# Altium footprint library Pezo_imp.PCBLIB: 98 footprints (part 1 of 7)
Each footprint in its own frame and in the unit in brackets; x right, y up, seen from the top. Pads: shape width x height; smd on the part's side, far side on the other; paste and mask are expansions set on the pad; w line width, h text height; cw(c..) or ccw(c..) is an arc to the next point about the centre after c.
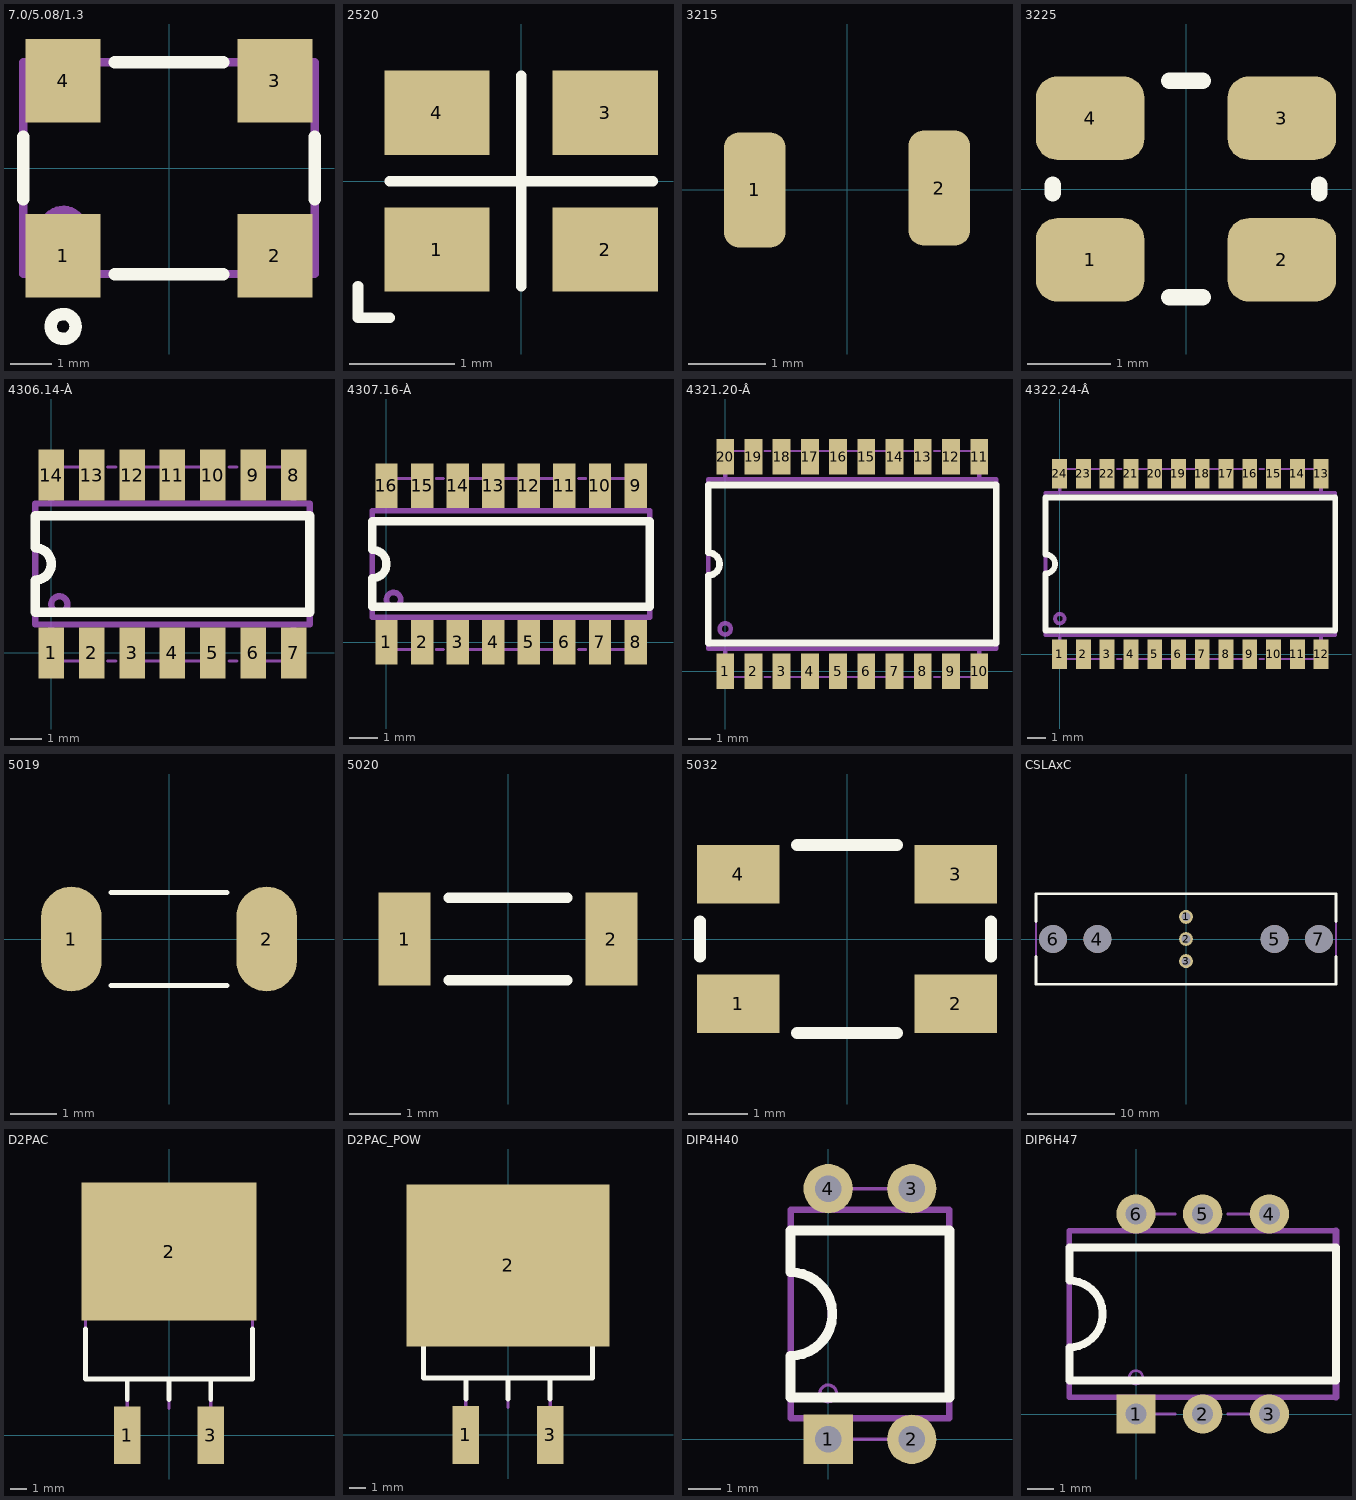
[diagram p0: the footprints below, top view; thin cyan lines are the x and y axes]

## 7.0/5.08/1.3 [mm]
height 1.3
pads (4):
  rect 1.8x2 smd: 1(-2.54,-2.1) 2(2.54,-2.1) 3(2.54,2.1) 4(-2.54,2.1)
Top Overlay:
  circle w0.3: c-2.54,-3.8 r0.3
  lines w0.3: -3.5,-0.75 -3.5,0.75 ; -1.3,-2.54 1.3,-2.54 ; -1.3,2.54 1.3,2.54 ; 3.5,-0.75 3.5,0.75
Mechanical 1:
  circle w0.2: c-2.54,-1.5 r0.5
  lines w0.2: -3.5,-2.54 -3.5,2.54 -2.84,2.54 ccw(c-2.54,2.54) -2.24,2.54 2.24,2.54 ccw(c2.54,2.54) 2.84,2.54 3.5,2.54 3.5,-2.54 2.84,-2.54 ccw(c2.54,-2.54) 2.24,-2.54 -2.24,-2.54 ccw(c-2.54,-2.54) -2.84,-2.54 -3.5,-2.54
  text "4" at -3.125,3.425 h1.5
  text "3" at 2.05,3.425 h1.5
  text "2" at 2.1,-5.1 h1.5
  text "1" at -2.875,-5.05 h1.5
  text ".Comment" at -3.025,-0.65 h1.5
  text ".Designator" at -3.075,0.8 h1.5

## 2520 [mm] "2.5x2.0x0.82mm Crystal"
height 0.8
pads (4):
  rect 1x0.8 smd: 1(-0.8,-0.65) 2(0.8,-0.65) 3(0.8,0.65) 4(-0.8,0.65)
Top Overlay:
  lines w0.1: -1.55,-1 -1.55,-1.3 -1.25,-1.3 ; -1.25,0 1.25,0 ; 0,-1 0,1
3D body "User Library-SM2520-4.step": height 0.8, standoff -0.03, extent -1.25,-1 1.25,1

## 3215 [mm]
pads (2):
  rrect50% 0.8x1.5 smd: 1(-1.2,0) 2(1.2,0.025)
3D body "User Library-KX-327NHT-1.step": height 0.72, standoff 0.01, extent -1.6,-0.75 1.6,0.75

## 3225 [mm] "3.2x2.5x0.8mm Crystal"
height 0.8
pads (4):
  rrect50% 1.3x1 smd: 1(-1.15,-0.85) 2(1.15,-0.85) 3(1.15,0.85) 4(-1.15,0.85)
Top Overlay:
  lines w0.2: -1.6,-0.05 -1.6,0.05 ; -0.2,-1.3 0.2,-1.3 ; -0.2,1.3 0.2,1.3 ; 1.6,-0.05 1.6,0.05
3D body "KX7.STEP": height 0.82, standoff 0.02, extent -1.607,-1.25 1.607,1.25

## 4306.14-À [mm]
height 1.7
pads (14):
  rect 0.8x1.6 smd: 1(0,0) 2(1.27,0) 3(2.54,0) 4(3.81,0) 5(5.08,0) 6(6.35,0) 7(7.62,0) 8(7.62,5.588) 9(6.35,5.588) 10(5.08,5.588) 11(3.81,5.588) 12(2.54,5.588) 13(1.27,5.588) 14(0,5.588)
Top Overlay:
  lines w0.3: -0.508,1.27 -0.508,2.286 ccw(c-0.508,2.794) -0.508,3.302 -0.508,4.318 8.128,4.318 8.128,1.27 -0.508,1.27
Mechanical 1:
  circle w0.2: c0.254,1.524 r0.254
  lines w0.1: 0,-0.254 1.27,-0.254 ; 0,5.842 1.27,5.842 ; 1.778,-0.254 2.032,-0.254 ; 1.778,5.842 2.032,5.842 ; 2.54,-0.254 5.08,-0.254 ; 2.54,5.842 5.08,5.842 ; 5.588,-0.254 5.842,-0.254 ; 5.588,5.842 5.842,5.842 ; 6.35,-0.254 7.62,-0.254 ; 6.35,5.842 7.62,5.842
  lines w0.2: 0,-0.254 0,0.762 ; 0,4.826 0,5.842 ; 7.62,-0.254 7.62,0.762 ; 7.62,4.826 7.62,5.842 ; -0.508,0.889 -0.508,4.699 8.128,4.699 8.128,0.889 -0.508,0.889
  text "14" at 0.01,3.4 h1.5
  text ".Comment" at 0.97,2.06 h1.5
  text ".Designator" at 2.05,3.48 h1.5
3D body "SO14h17.stp": height 1.71, standoff 0, extent -0.6,-0.35 8.21,5.95

## 4307.16-À [mm]
height 1.7
pads (16):
  rect 0.8x1.6 smd: 1(0,0) 2(1.27,0) 3(2.54,0) 4(3.81,0) 5(5.08,0) 6(6.35,0) 7(7.62,0) 8(8.89,0) 9(8.89,5.588) 10(7.62,5.588) 11(6.35,5.588) 12(5.08,5.588) 13(3.81,5.588) 14(2.54,5.588) 15(1.27,5.588) 16(0,5.588)
Top Overlay:
  lines w0.3: -0.508,1.27 -0.508,2.286 ccw(c-0.508,2.794) -0.508,3.302 -0.508,4.318 9.398,4.318 9.398,1.27 -0.508,1.27
Mechanical 1:
  circle w0.2: c0.254,1.524 r0.254
  lines w0.1: 0,-0.254 1.27,-0.254 ; 0,5.842 1.27,5.842 ; 1.778,-0.254 2.032,-0.254 ; 1.778,5.842 2.032,5.842 ; 2.54,-0.254 6.35,-0.254 ; 2.54,5.842 6.35,5.842 ; 6.858,-0.254 7.112,-0.254 ; 6.858,5.842 7.112,5.842 ; 7.62,-0.254 8.89,-0.254 ; 7.62,5.842 8.89,5.842
  lines w0.2: 0,-0.254 0,0.762 ; 0,4.826 0,5.842 ; 8.89,-0.254 8.89,0.762 ; 8.89,4.826 8.89,5.842 ; -0.508,0.889 -0.508,4.699 9.398,4.699 9.398,0.889 -0.508,0.889
  text "16" at -0.127,3.556 h1.5
  text ".Designator" at 2.55,3.18 h1.5
  text ".Comment" at 1.47,1.76 h1.5
3D body "SO16h17.stp": height 1.71, standoff 0, extent -0.595,-0.356 9.485,5.944

## 4321.20-Â [mm]
height 2.6
pads (20):
  rect 0.8x1.6 smd: 1(0,0) 2(1.27,0) 3(2.54,0) 4(3.81,0) 5(5.08,0) 6(6.35,0) 7(7.62,0) 8(8.89,0) 9(10.16,0) 10(11.43,0) 11(11.43,9.652) 12(10.16,9.652) 13(8.89,9.652) 14(7.62,9.652) 15(6.35,9.652) 16(5.08,9.652) 17(3.81,9.652) 18(2.54,9.652) 19(1.27,9.652) 20(0,9.652)
Top Overlay:
  lines w0.3: -0.76,1.27 -0.76,4.318 ccw(c-0.76,4.826) -0.76,5.334 -0.76,8.382 12.19,8.382 12.19,1.27 -0.76,1.27
Mechanical 1:
  circle w0.2: c0,1.905 r0.254
  lines w0.1: 0,-0.254 1.27,-0.254 ; 0,9.906 1.27,9.906 ; 1.778,-0.254 2.032,-0.254 ; 1.778,9.906 2.032,9.906 ; 2.54,-0.254 8.89,-0.254 ; 2.54,9.906 8.89,9.906 ; 9.398,-0.254 9.652,-0.254 ; 9.398,9.906 9.652,9.906 ; 10.16,-0.254 11.43,-0.254 ; 10.16,9.906 11.43,9.906
  lines w0.2: 0,-0.254 0,1.016 ; 0,8.636 0,9.906 ; 11.43,-0.254 11.43,1.016 ; 11.43,8.636 11.43,9.906 ; -0.76,1.016 -0.76,8.636 12.19,8.636 12.19,1.016 -0.76,1.016
  text "20" at 0,7 h1.5
  text ".Comment" at 2.865,3.58 h1.5
  text ".Designator" at 4.455,5.28 h1.5
3D body "SOIC20h26.stp": height 2.61, standoff 0, extent -0.76,-0.499 12.19,10.151

## 4322.24-Â [mm]
height 2.6
pads (24):
  rect 0.8x1.6 smd: 1(0,0) 2(1.27,0) 3(2.54,0) 4(3.81,0) 5(5.08,0) 6(6.35,0) 7(7.62,0) 8(8.89,0) 9(10.16,0) 10(11.43,0) 11(12.7,0) 12(13.97,0) 13(13.97,9.652) 14(12.7,9.652) 15(11.43,9.652) 16(10.16,9.652) 17(8.89,9.652) 18(7.62,9.652) 19(6.35,9.652) 20(5.08,9.652) 21(3.81,9.652) 22(2.54,9.652) 23(1.27,9.652) 24(0,9.652)
Top Overlay:
  lines w0.3: -0.76,1.27 -0.76,4.318 ccw(c-0.76,4.826) -0.76,5.334 -0.76,8.382 14.73,8.382 14.73,1.27 -0.76,1.27
Mechanical 1:
  circle w0.2: c0,1.905 r0.254
  lines w0.1: 0,-0.254 2.54,-0.254 ; 0,9.906 2.54,9.906 ; 3.048,-0.254 3.302,-0.254 ; 3.048,9.906 3.302,9.906 ; 3.81,-0.254 10.16,-0.254 ; 3.81,9.906 10.16,9.906 ; 10.668,-0.254 10.922,-0.254 ; 10.668,9.906 10.922,9.906 ; 11.43,-0.254 13.97,-0.254 ; 11.43,9.906 13.97,9.906
  lines w0.2: 0,-0.254 0,1.016 ; 0,8.636 0,9.906 ; 13.97,-0.254 13.97,1.016 ; 13.97,8.636 13.97,9.906 ; -0.76,1.016 -0.76,8.636 14.73,8.636 14.73,1.016 -0.76,1.016
  text "24" at 0,7 h1.5
  text ".Comment" at 3.88,3.605 h1.5
  text ".Designator" at 5.85,5.311 h1.5
3D body "SOIC24h26.stp": height 2.61, standoff 0, extent -0.76,-0.499 14.73,10.151

## 5019 [mm]
pads (2):
  oval 1.3x2.25 smd mask+0.1: 1(-2.1,0) 2(2.1,0)
Top Overlay:
  lines w0.1: -1.25,-1 1.25,-1 ; -1.25,1 1.25,1
3D body: height 0.9, standoff 0, extent -2.5,-1 2.5,1

## 5020 [mm]
pads (2):
  rect 1x1.8 smd mask+0.1: 1(-2,0) 2(2,0)
Top Overlay:
  lines w0.2: -1.15,-0.8 1.15,-0.8 ; -1.15,0.8 1.15,0.8
3D body "ASB 10.STEP": height 1.01, standoff 0.01, extent -2.45,-0.9 2.45,0.9

## 5032 [mm]
pads (4):
  rect 1.4x1 smd: 1(-1.85,-1.1) 2(1.85,-1.1) 3(1.85,1.1) 4(-1.85,1.1)
Top Overlay:
  lines w0.2: -2.5,-0.3 -2.5,0.3 ; -0.85,-1.6 0.85,-1.6 ; -0.85,1.6 0.85,1.6 ; 2.45,-0.3 2.45,0.3
3D body "User Library-CRYSTALSMD5X32.step": height 1.01, standoff 0.01, extent -2.5,-1.6 2.5,1.6

## CSLAxC [mm]
height 35.6
pads (7):
  round 1.6 hole 1: 1(0,2.54) 2(0,0) 3(0,-2.54)
  round 3.2 hole 3.2 unplated: 4(-10.16,0) 5(10.16,0) 6(-15.24,0) 7(15.24,0)
Top Overlay:
  lines w0.3: -17.2,-2 -17.2,-5.2 17.2,-5.2 17.2,-2 ; -17.2,2 -17.2,5.2 17.2,5.2 17.2,2
Mechanical 1:
  lines w0.2: -17.2,-5.2 17.2,-5.2 17.2,5.2 -17.2,5.2 -17.2,-5.2
  text ".Designator" at -2.276,5.788 h1.5
  text ".Comment" at -2.286,-6.985 h1.5
  text "out" at -3.6,-0.4 h2
  text "-" at -2.2,-3 h2
  text "+" at -2.4,1.9 h2
3D body "CSLA1CX.STEP": height 35.56, standoff -3, extent -17.15,-5.2 17.15,5.2

## D2PAC [mm]
height 2.38
pads (3):
  rect 1.6x3.5 smd: 1(-2.54,0) 3(2.54,0)
  rect 10.66x8.38 smd: 2(0,11.176)
Top Overlay:
  lines w0.3: -5.08,6.477 -5.08,3.429 5.08,3.429 5.08,6.477 ; -2.54,2.159 -2.54,3.429 ; 0,2.159 0,3.429 ; 2.54,2.159 2.54,3.429
Mechanical 1:
  lines w0.2: -4.826,12.7 -4.826,13.081 -3.937,13.97 3.937,13.97 4.826,13.081 4.826,12.7 ; -2.54,-0.254 -2.54,3.429 ; 0,1.651 0,3.429 ; 2.54,-0.254 2.54,3.429 ; -5.08,3.429 -5.08,12.7 5.08,12.7 5.08,3.429 -5.08,3.429
  text ".Designator" at -3.048,8.255 h1.5
  text ".Comment" at -2.921,5.715 h1.5
  text "2" at -0.254,4.064 h1.5
  text "1" at -2.667,4.064 h1.5
  text "3" at 2.286,4.064 h1.5
3D body "D2PAC.STEP": height 4.5, standoff -0.01, extent -5.08,-0.508 5.08,13.869

## D2PAC_POW [mm]
height 2.38
pads (3):
  rect 1.6x3.5 smd: 1(-2.54,0) 3(2.54,0)
  rect 12.2x9.75 smd: 2(0,10.2)
Top Overlay:
  lines w0.3: -5.08,6.477 -5.08,3.429 5.08,3.429 5.08,6.477 ; -2.54,2.159 -2.54,3.429 ; 0,2.159 0,3.429 ; 2.54,2.159 2.54,3.429
Mechanical 1:
  lines w0.2: -4.826,12.7 -4.826,13.081 -3.937,13.97 3.937,13.97 4.826,13.081 4.826,12.7 ; -2.54,-0.254 -2.54,3.429 ; 0,1.651 0,3.429 ; 2.54,-0.254 2.54,3.429 ; -5.08,3.429 5.08,3.429 5.08,12.7 -5.08,12.7 -5.08,3.429
  text "3" at 2.286,4.064 h1.5
  text "1" at -2.667,4.064 h1.5
  text "2" at -0.254,4.064 h1.5
  text ".Comment" at -2.921,5.715 h1.5
  text ".Designator" at -3.048,8.255 h1.5
3D body "D2PAC.STEP": height 4.5, standoff -0.01, extent -5.08,-0.508 5.08,13.869

## DIP4H40 [mm]
height 4
pads (4):
  rect 1.5x1.5 hole 0.8: 1(0,0)
  round 1.5 hole 0.8: 2(2.54,0) 3(2.54,7.62) 4(0,7.62)
Top Overlay:
  lines w0.3: -1.143,1.27 -1.143,2.54 ccw(c-1.143,3.81) -1.143,5.08 -1.143,6.35 3.683,6.35 3.683,1.27 -1.143,1.27
Mechanical 1:
  circle w0.1: c0,1.397 r0.254
  lines w0.025: -1.27,2.54 ccw(c-1.27,3.81) -1.27,5.08
  lines w0.1: 0,0 2.54,0 ; 0,7.62 2.54,7.62 ; 2.35,-0.02 2.604,-0.02 ; 2.35,7.6 2.604,7.6
  lines w0.2: 0,0 0,0.635 ; 0,6.985 0,7.62 ; 2.54,0 2.54,0.488 ; 2.54,6.985 2.54,7.62 ; -1.143,0.635 -1.143,6.985 3.683,6.985 3.683,0.635 -1.143,0.635
  text ".Comment" at -0.56,2.57 h1.5
  text ".Designator" at -2.032,4.318 h1.5
  text "4" at -0.19,5.64 h1.5
3D body "PC814C.STEP": height 4, standoff -2.7, extent -1.024,-0.13 3.556,7.75

## DIP6H47 [mm]
height 4.7
pads (6):
  rect 1.5x1.5 hole 0.8: 1(0,0)
  round 1.5 hole 0.8: 2(2.54,0) 3(5.08,0) 4(5.08,7.62) 5(2.54,7.62) 6(0,7.62)
Top Overlay:
  lines w0.3: -2.54,1.27 -2.54,2.54 ccw(c-2.54,3.81) -2.54,5.08 -2.54,6.35 7.62,6.35 7.62,1.27 -2.54,1.27
Mechanical 1:
  circle w0.1: c0,1.397 r0.254
  lines w0.025: -2.54,2.54 ccw(c-2.54,3.81) -2.54,5.08
  lines w0.1: 0,0 1.5,0 ; 0,7.62 1.5,7.62 ; 2.35,-0.02 2.604,-0.02 ; 2.35,7.6 2.604,7.6 ; 3.5,0 5.1,0 ; 3.5,7.62 5.1,7.62
  lines w0.2: 0,0 0,0.635 ; 0,6.985 0,7.62 ; 5.1,0 5.1,0.635 ; 5.1,6.985 5.1,7.62 ; 7.62,0.635 -2.54,0.635 -2.54,6.985 7.62,6.985
  lines w0.25: 7.62,0.635 7.62,6.985
  text "6" at -0.19,5.64 h1.5
  text ".Designator" at 1.03,4.27 h1.5
  text ".Comment" at -0.56,2.57 h1.5
3D body "DIP6h47.stp": height 4.72, standoff -3, extent -2.55,-0.12 7.61,7.77